# Altium footprint library DiscreteSemiconductors.PcbLib: 111 footprints (part 1 of 7)
Each footprint in its own frame and in the unit in brackets; x right, y up, seen from the top. Pads: shape width x height; smd on the part's side, far side on the other; paste and mask are expansions set on the pad; w line width, h text height; cw(c..) or ccw(c..) is an arc to the next point about the centre after c.
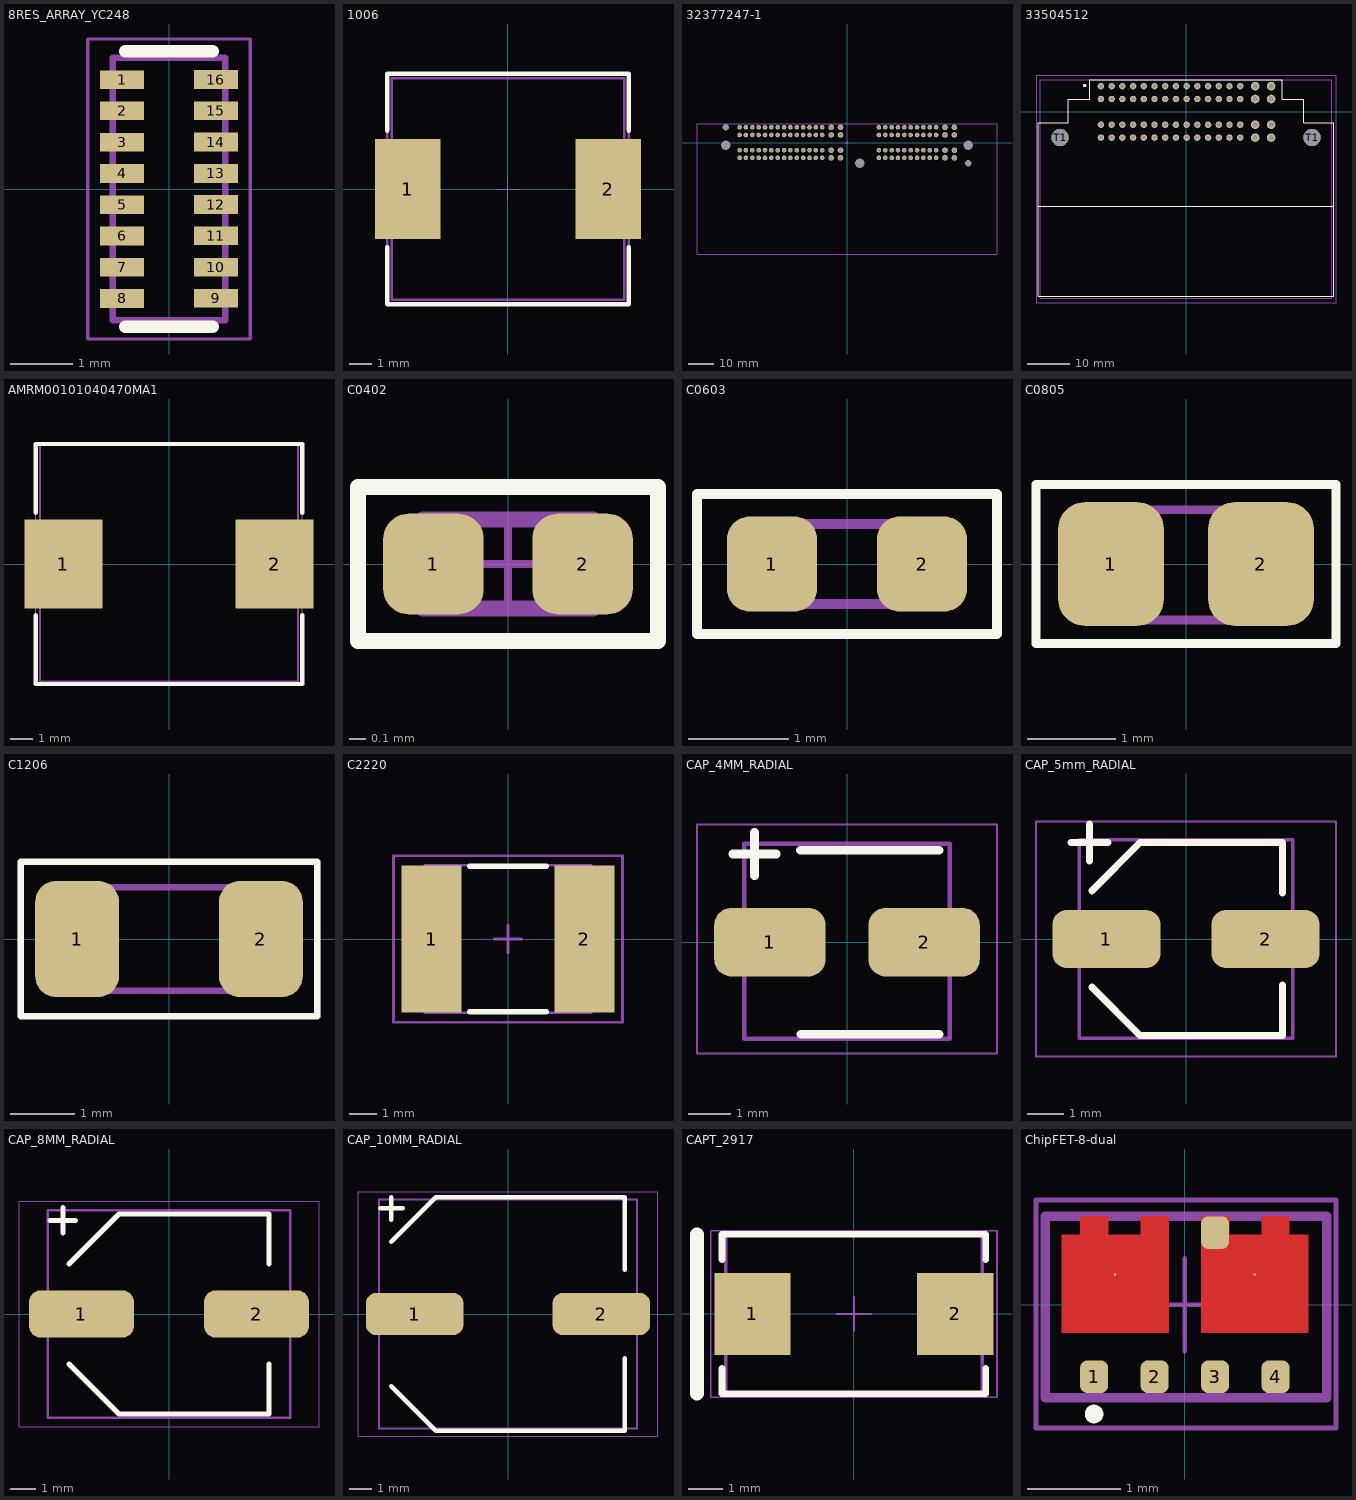
[diagram p0: the footprints below, top view; thin cyan lines are the x and y axes]

## 8RES_ARRAY_YC248 [mm] "Chip Resistor Surface Mount, 8 Resistors, 4x1.6mm"
height 1.45
pads (16):
  rect 0.7x0.3 smd: 1(-0.75,1.75) 2(-0.75,1.25) 3(-0.75,0.75) 4(-0.75,0.25) 5(-0.75,-0.25) 6(-0.75,-0.75) 7(-0.75,-1.25) 8(-0.75,-1.75) 9(0.75,-1.75) 10(0.75,-1.25) 11(0.75,-0.75) 12(0.75,-0.25) 13(0.75,0.25) 14(0.75,0.75) 15(0.75,1.25) 16(0.75,1.75)
Top Overlay:
  lines w0.2: -0.7,-2.2 0.7,-2.2 ; -0.7,2.2 0.7,2.2
Mechanical 13:
  lines w0.1: -0.9,-2.1 -0.9,2.1 0.9,2.1 0.9,-2.1 -0.9,-2.1
Mechanical 15:
  lines w0.05: -1.3,-2.4 -1.3,2.4 1.3,2.4 1.3,-2.4 -1.3,-2.4
3D body "RES_ARRAY_YC248_YAG.step": height -0.39, standoff -0.95, extent -0.876,-2.096 0.876,2.096

## 1006 [mm] "1006 / 10,50mm x 10,00mm"
height 6.5
pads (2):
  rect 2.95x4.5 smd paste+0 mask+0: 1(-4.525,0) 2(4.525,0)
Top Overlay:
  lines w0.2: -5.45,-2.625 -5.45,-5.2 5.45,-5.2 5.45,-2.625 ; -5.45,2.625 -5.45,5.2 5.45,5.2 5.45,2.625
Board:
  lines w0.1: -5.45,-5.2 5.45,-5.2 5.45,5.2 -5.45,5.2 -5.45,-5.2
Top Assembly:
  lines w0.1: -5.25,-5 5.25,-5 5.25,5 -5.25,5 -5.25,-5
Mechanical 15:
  lines w0.05: -0.5,0 0.5,0 ; 0,-0.5 0,0.5
3D body "Ind_TDK_SPM10065VT-6R8M-D_eec.STEP": height 6.5, standoff 0, extent -5.25,-5 5.25,5

## 32377247-1 [mm] "Automotive Connector 112Pin"
height 30.6
pads (117):
  round 1.8 hole 1.25: 1(-42.25,6) 2(-39.75,6) 3(-37.25,6) 4(-34.75,6) 5(-32.25,6) 6(-29.75,6) 7(-27.25,6) 8(-24.75,6) 9(-22.25,6) 10(-19.75,6) 11(-17.25,6) 12(-14.75,6) 13(-12.25,6) 14(-9.75,6) 17(-42.25,3) 18(-39.75,3) 19(-37.25,3) 20(-34.75,3) 21(-32.25,3) 22(-29.75,3) 23(-27.25,3) 24(-24.75,3) 25(-22.25,3) 26(-19.75,3) 27(-17.25,3) 28(-14.75,3) 29(-12.25,3) 30(-9.75,3) 33(-42.25,-3) 34(-39.75,-3) 35(-37.25,-3) 36(-34.75,-3) 37(-32.25,-3) 38(-29.75,-3) 39(-27.25,-3) 40(-24.75,-3) 41(-22.25,-3) 42(-19.75,-3) 43(-17.25,-3) 44(-14.75,-3) 45(-12.25,-3) 46(-9.75,-3) 49(-42.25,-6) 50(-39.75,-6) 51(-37.25,-6) 52(-34.75,-6) 53(-32.25,-6) 54(-29.75,-6) 55(-27.25,-6) 56(-24.75,-6) 57(-22.25,-6) 58(-19.75,-6) 59(-17.25,-6) 60(-14.75,-6) 61(-12.25,-6) 62(-9.75,-6) 65(12.55,6) 66(15.05,6) 67(17.55,6) 68(20.05,6) 69(22.55,6) 70(25.05,6) 71(27.55,6) 72(30.05,6) 73(32.55,6) 74(35.05,6) 77(12.55,3) 78(15.05,3) 79(17.55,3) 80(20.05,3) 81(22.55,3) 82(25.05,3) 83(27.55,3) 84(30.05,3) 85(32.55,3) 86(35.05,3) 89(12.55,-3) 90(15.05,-3) 91(17.55,-3) 92(20.05,-3) 93(22.55,-3) 94(25.05,-3) 95(27.55,-3) 96(30.05,-3) 97(32.55,-3) 98(35.05,-3) 101(12.55,-6) 102(15.05,-6) 103(17.55,-6) 104(20.05,-6) 105(22.55,-6) 106(25.05,-6) 107(27.55,-6) 108(30.05,-6) 109(32.55,-6) 110(35.05,-6)
  round 2.2 hole 1.6: 15(-6.25,6) 16(-2.55,6) 31(-6.25,3) 32(-2.55,3) 47(-6.25,-3) 48(-2.55,-3) 63(-6.25,-6) 64(-2.55,-6) 75(38.55,6) 76(42.25,6) 87(38.55,3) 88(42.25,3) 99(38.55,-3) 100(42.25,-3) 111(38.55,-6) 112(42.25,-6)
  round 1 hole 3.8 unplated: MH(-47.7,-1.05) MH(5,-8.15) MH(47.7,-1.05)
  round 1 hole 2.6 unplated: MH(-47.7,6) MH(47.7,-8.1)
Mechanical 13:
  lines w0.1: -59,-44 -59,7.5 59,7.5 59,-44 -59,-44
Mechanical 15:
  lines w0.05: -0.5,0 0.5,0 ; 0,-0.5 0,0.5 ; -59,-44 -59,7.5 59,7.5 59,-44 -59,-44
3D body "c-2377247-1-a-3d.stp": height 30.9, standoff -5.2, extent -59,-44 59,7.45

## 33504512 [mm] "Automotive Connectors 64W HEADER"
height 32.2
pads (66):
  round 1.5 hole 1: 1A(-19.85,6) 1B(-17.35,6) 1C(-14.85,6) 1D(-12.35,6) 1E(-9.85,6) 1F(-7.35,6) 1G(-4.85,6) 1H(-2.35,6) 1J(0.15,6) 1K(2.65,6) 1L(5.15,6) 1M(7.65,6) 1N(10.15,6) 1O(12.65,6) 2A(-19.85,3) 2B(-17.35,3) 2C(-14.85,3) 2D(-12.35,3) 2E(-9.85,3) 2F(-7.35,3) 2G(-4.85,3) 2H(-2.35,3) 2J(0.15,3) 2K(2.65,3) 2L(5.15,3) 2M(7.65,3) 2N(10.15,3) 2O(12.65,3) 3A(-19.85,-3) 3B(-17.35,-3) 3C(-14.85,-3) 3D(-12.35,-3) 3E(-9.85,-3) 3F(-7.35,-3) 3G(-4.85,-3) 3H(-2.35,-3) 3J(0.15,-3) 3K(2.65,-3) 3L(5.15,-3) 3M(7.65,-3) 3N(10.15,-3) 3O(12.65,-3) 4A(-19.85,-6) 4B(-17.35,-6) 4C(-14.85,-6) 4D(-12.35,-6) 4E(-9.85,-6) 4F(-7.35,-6) 4G(-4.85,-6) 4H(-2.35,-6) 4J(0.15,-6) 4K(2.65,-6) 4L(5.15,-6) 4M(7.65,-6) 4N(10.15,-6) 4O(12.65,-6)
  round 2 hole 1.3: 1P(16.15,6) 1Q(19.85,6) 2P(16.15,3) 2Q(19.85,3) 3P(16.15,-3) 3Q(19.85,-3) 4P(16.15,-6) 4Q(19.85,-6)
  round 4 hole 4 unplated: T1(-29.4,-6)
  round 4 hole 4: T1(29.4,-6)
Top Overlay:
  circle w0.5: c-23.625,6.15 r0.125
  lines w0.2: -34.5,-22 -34.5,-43 34.5,-43 34.5,-22 ; -34.5,-22 34.5,-22 ; -34.5,-22 -34.5,-2.5 -29,-2.5 -27.5,-2.5 -27.5,3 -22.5,3 -22.5,5 -22.5,7.5 22.5,7.5 22.5,5 22.5,3 27.5,3 27.5,-2.5 29,-2.5 34.5,-2.5 34.5,-22
Mechanical 13:
  lines w0.1: -34,-43.5 -34,7.5 34,7.5 34,-43.5 -34,-43.5
Mechanical 15:
  lines w0.05: -35,-44.5 35,-44.5 35,8.5 -35,8.5 -35,-44.5
3D body "c-2209129-1-a-3d.stp": height 32.1, standoff -4.8, extent -33.932,-43.1 33.932,7.5

## AMRM00101040470MA1 [mm] "Inductor 11.6x10.2"
height 3.8
pads (2):
  rect 3.5x4 smd: 1(-4.75,0) 2(4.75,0)
Top Overlay:
  lines w0.2: -6,-2.3 -6,-5.4 6,-5.4 6,-2.3 ; -6,2.3 -6,5.4 6,5.4 6,2.3
Mechanical 13:
  lines w0.1: -5.8,-5.3 5.8,-5.3 5.8,5.4 -5.8,5.4 -5.8,-5.3
Mechanical 15:
  lines w0.05: -6,-5.4 6,-5.4 6,5.4 -6,5.4 -6,-5.4
3D body "IND_AMRM00101040_PUL.step": height 3.99, standoff 0, extent -5.804,-5.245 5.804,5.245

## C0402 [mm] "Chip Capacitor, 2-Leads, Body 1.00x0.50mm, IPC Medium Density"
height 0.55
pads (2):
  rrect50% 0.62x0.62 smd: 1(-0.46,0) 2(0.46,0)
Top Overlay:
  lines w0.1: -0.925,-0.475 0.925,-0.475 0.925,0.475 -0.925,0.475 -0.925,-0.475
Mechanical 13:
  lines w0.1: -0.525,-0.275 0.525,-0.275 0.525,0.275 -0.525,0.275 -0.525,-0.275
Mechanical 15:
  lines w0.05: -0.275,0 0.275,0 ; 0,-0.275 0,0.275 ; -0.925,-0.475 0.925,-0.475 0.925,0.475 -0.925,0.475 -0.925,-0.475
3D body "User Library-CAP_0402.step": height 0.55, standoff 0, extent -0.525,-0.275 0.525,0.275

## C0603 [mm] "Chip Capacitor, 2-Leads, Body 1.75x0.95mm"
height 0.55
pads (2):
  rrect50% 0.9x0.95 smd: 1(-0.75,0) 2(0.75,0)
Top Overlay:
  lines w0.1: -1.5,-0.7 -1.5,0.7 1.5,0.7 1.5,-0.7 -1.5,-0.7
Mechanical 13:
  lines w0.1: -0.8,-0.4 0.8,-0.4 0.8,0.4 -0.8,0.4 -0.8,-0.4
Mechanical 15:
  lines w0.05: -1.5,-0.7 1.5,-0.7 1.5,0.7 -1.5,0.7 -1.5,-0.7
3D body "User Library-cap_0603-1.step": height 0.8, standoff 0, extent -0.8,-0.4 0.8,0.4

## C0805 [mm] "Chip Capacitor, 2-Leads, Body 2.00x1.25mm, IPC Medium Density"
height 1.35
pads (2):
  rrect50% 1.2x1.4 smd: 1(-0.85,0) 2(0.85,0)
Top Overlay:
  lines w0.1: -1.7,-0.9 1.7,-0.9 1.7,0.9 -1.7,0.9 -1.7,-0.9
Mechanical 13:
  lines w0.1: -1.05,-0.635 -1.05,0.615 1.05,0.615 1.05,-0.635 -1.05,-0.635
Mechanical 15:
  lines w0.05: -1.7,-0.9 -1.7,0.9 1.7,0.9 1.7,-0.9 -1.7,-0.9
3D body "GRM2165C1H220JZ01D.stp": height 0.7, standoff 0, extent -1,-0.635 1,0.615

## C1206 [mm] "Chip Capacitor, 2-Leads, Body 3.20x1.60mm, IPC Medium Density"
height 1.25
pads (2):
  rrect50% 1.3x1.8 smd: 1(-1.425,0) 2(1.425,0)
Top Overlay:
  lines w0.1: -2.3,-1.2 2.3,-1.2 2.3,1.2 -2.3,1.2 -2.3,-1.2
Mechanical 13:
  lines w0.1: -1.6,-0.8 -1.6,0.8 1.6,0.8 1.6,-0.8 -1.6,-0.8
Mechanical 15:
  lines w0.05: -2.325,-1.2 -2.325,1.2 2.325,1.2 2.325,-1.2 -2.325,-1.2
3D body "1206DD106KAT2A.stp": height 0.75, standoff 0, extent -1.6,-0.8 1.6,0.8

## C2220 [mm]
height 1.35
pads (2):
  rect 2.2x5.4 smd: 1(-2.794,0) 2(2.794,0)
Top Overlay:
  lines w0.2: -1.397,-2.667 1.397,-2.667 ; -1.397,2.667 1.397,2.667
Top 3D Body:
  lines w0.1: -3.05,-2.7 3.05,-2.7 3.05,2.7 -3.05,2.7 -3.05,-2.7
Top Courtyard:
  lines w0.1: -0.5,0 0.5,0 ; 0,-0.5 0,0.5 ; -4.191,-3.048 4.191,-3.048 4.191,3.048 -4.191,3.048 -4.191,-3.048
3D body "CAP 2020-1.5mm.STEP": height 1.5, standoff 0, extent -2.85,-2.5 2.85,2.5

## CAP_4MM_RADIAL [mm] "Capacitor radial package: Diameter 4.00mm"
height 4.3
pads (2):
  rrect50% 2.6x1.6 smd: 1(-1.8,0) 2(1.8,0)
Top Overlay:
  lines w0.2: -2.667,2.059 -1.651,2.059 ; -2.159,1.551 -2.159,2.567 ; -1.093,2.15 2.15,2.15 ; -1.075,-2.15 2.15,-2.15
Mechanical 13:
  lines w0.1: -2.4,-2.25 -2.4,2.3 2.4,2.3 2.4,-2.25 -2.4,-2.25
Mechanical 15:
  lines w0.05: -3.5,-2.6 -3.5,2.75 3.5,2.75 3.5,-2.6 -3.5,-2.6
3D body "UCQ1E4R7MCL1GB.stp": height 4.7, standoff 0, extent -2.4,-2.25 2.4,2.25

## CAP_5mm_RADIAL [mm] "Capacitor radial package: Diameter 5.00mm"
height 5.4
pads (2):
  rrect50% 3x1.6 smd: 1(-2.2,0) 2(2.2,0)
Top Overlay:
  lines w0.2: -3.175,2.667 -2.159,2.667 ; -2.667,2.159 -2.667,3.175 ; -2.603,-1.333 -1.27,-2.667 2.667,-2.667 2.667,-1.27 ; -2.603,1.333 -1.27,2.667 2.667,2.667 2.667,1.27
Mechanical 13:
  lines w0.1: -2.95,-2.75 -2.95,2.75 2.95,2.75 2.95,-2.75 -2.95,-2.75
Mechanical 15:
  lines w0.05: -4.15,-3.25 4.15,-3.25 4.15,3.25 -4.15,3.25 -4.15,-3.25
3D body "UWX0J470MCL1GB.stp": height 5.5, standoff 0, extent -2.95,-2.75 2.95,2.75

## CAP_8MM_RADIAL [mm] "Capacitor radial package: Diameter 8.00mm"
height 10.5
pads (2):
  rrect50% 4.2x1.9 smd: 1(-3.5,0) 2(3.5,0)
Top Overlay:
  lines w0.2: -4.758,3.75 -3.742,3.75 ; -4.25,3.242 -4.25,4.258 ; -4,-2 -2,-4 4,-4 4,-2 ; -4,2 -2,4 4,4 4,2
Mechanical 13:
  lines w0.1: -4.85,-4.15 4.85,-4.15 4.85,4.15 -4.85,4.15 -4.85,-4.15
Mechanical 15:
  lines w0.05: -6,-4.5 -6,4.5 6,4.5 6,-4.5 -6,-4.5
3D body "User Library-SMD 8x10.step": height 8.5, standoff 0, extent -4.85,-4.15 4.85,4.15

## CAP_10MM_RADIAL [mm] "Capacitor radial package: Diameter 10.00mm"
height 10.5
pads (2):
  rrect50% 4.4x1.9 smd: 1(-4.2,0) 2(4.2,0)
Top Overlay:
  lines w0.2: -5.758,4.75 -4.742,4.75 ; -5.25,-3.25 -3.25,-5.25 5.25,-5.25 5.25,-2 ; -5.25,3.25 -3.25,5.25 5.25,5.25 5.25,2 ; -5.25,4.242 -5.25,5.258
Mechanical 13:
  lines w0.1: -5.8,-5.15 -5.8,5.15 5.8,5.15 5.8,-5.15 -5.8,-5.15
Mechanical 15:
  lines w0.05: -6.75,-5.5 6.75,-5.5 6.75,5.5 -6.75,5.5 -6.75,-5.5
3D body "User Library-ALU-G.STEP": height 10.2, standoff 0, extent -5.8,-5.15 5.8,5.15

## CAPT_2917 [mm] "Tantalum capacitor SMD package: 7.30x4.30mm"
height 4.1
pads (2):
  rect 2.2x2.35 smd: 1(-2.925,0) 2(2.925,0)
Top Overlay:
  lines w0.2: -3.8,-1.575 -3.8,-2.3 3.8,-2.3 3.8,-1.575 ; -3.8,1.575 -3.8,2.3 3.8,2.3 3.8,1.575
  lines w0.4: -4.525,-2.3 -4.525,2.3
Mechanical 13:
  lines w0.1: -3.7,-2.3 -3.7,2.3 3.7,2.3 3.7,-2.3 -3.7,-2.3
Mechanical 15:
  lines w0.05: -0.5,0 0.5,0 ; 0,-0.5 0,0.5 ; -4.125,-2.4 -4.125,2.4 4.125,2.4 4.125,-2.4 -4.125,-2.4
3D body "User Library-AVX_E_CASE.STEP": height 4.2, standoff 0, extent -3.7,-2.225 3.7,2.225

## ChipFET-8-dual [mm] "PowerPAK® ChipFET® Dual, 1.9x3mm"
height 0.8
pads (7):
  rrect50% 0.3x0.35 smd: 1(-0.975,-0.775) 2(-0.325,-0.775) 3(0.325,-0.775) 4(0.975,-0.775) ""(0.325,0.775)
  round 0.025 smd: 5/6(0.75,0.325) 7/8(-0.75,0.325)
Top Layer:
  region: -1.325,-0.3 -1.325,0.75 -1.125,0.75 -1.125,0.95 -0.825,0.95 -0.825,0.75 -0.475,0.75 -0.475,0.95 -0.175,0.95 -0.175,-0.3
  region: 1.325,-0.3 1.325,0.75 1.125,0.75 1.125,0.95 0.825,0.95 0.825,0.75 0.475,0.75 0.475,0.95 0.175,0.95 0.175,-0.3
Top Overlay:
  circle w0.1: c-0.975,-1.175 r0.05
Mechanical 13:
  lines w0.1: -1.5,-1 -1.5,0.95 1.525,0.95 1.525,-1 -1.5,-1
Mechanical 15:
  lines w0.05: -0.5,0 0.5,0 ; 0,-0.5 0,0.5 ; -1.6,-1.325 -1.6,1.125 1.625,1.125 1.625,-1.325 -1.6,-1.325
3D body "User Library-ChipFet_1206.STEP": height -0.4, standoff -1.45, extent -1.525,-0.95 1.525,0.95